# Altium footprint library Footprints.PcbLib: 29 footprints (part 1 of 2)
Each footprint in its own frame and in the unit in brackets; x right, y up, seen from the top. Pads: shape width x height; smd on the part's side, far side on the other; paste and mask are expansions set on the pad; w line width, h text height; cw(c..) or ccw(c..) is an arc to the next point about the centre after c.
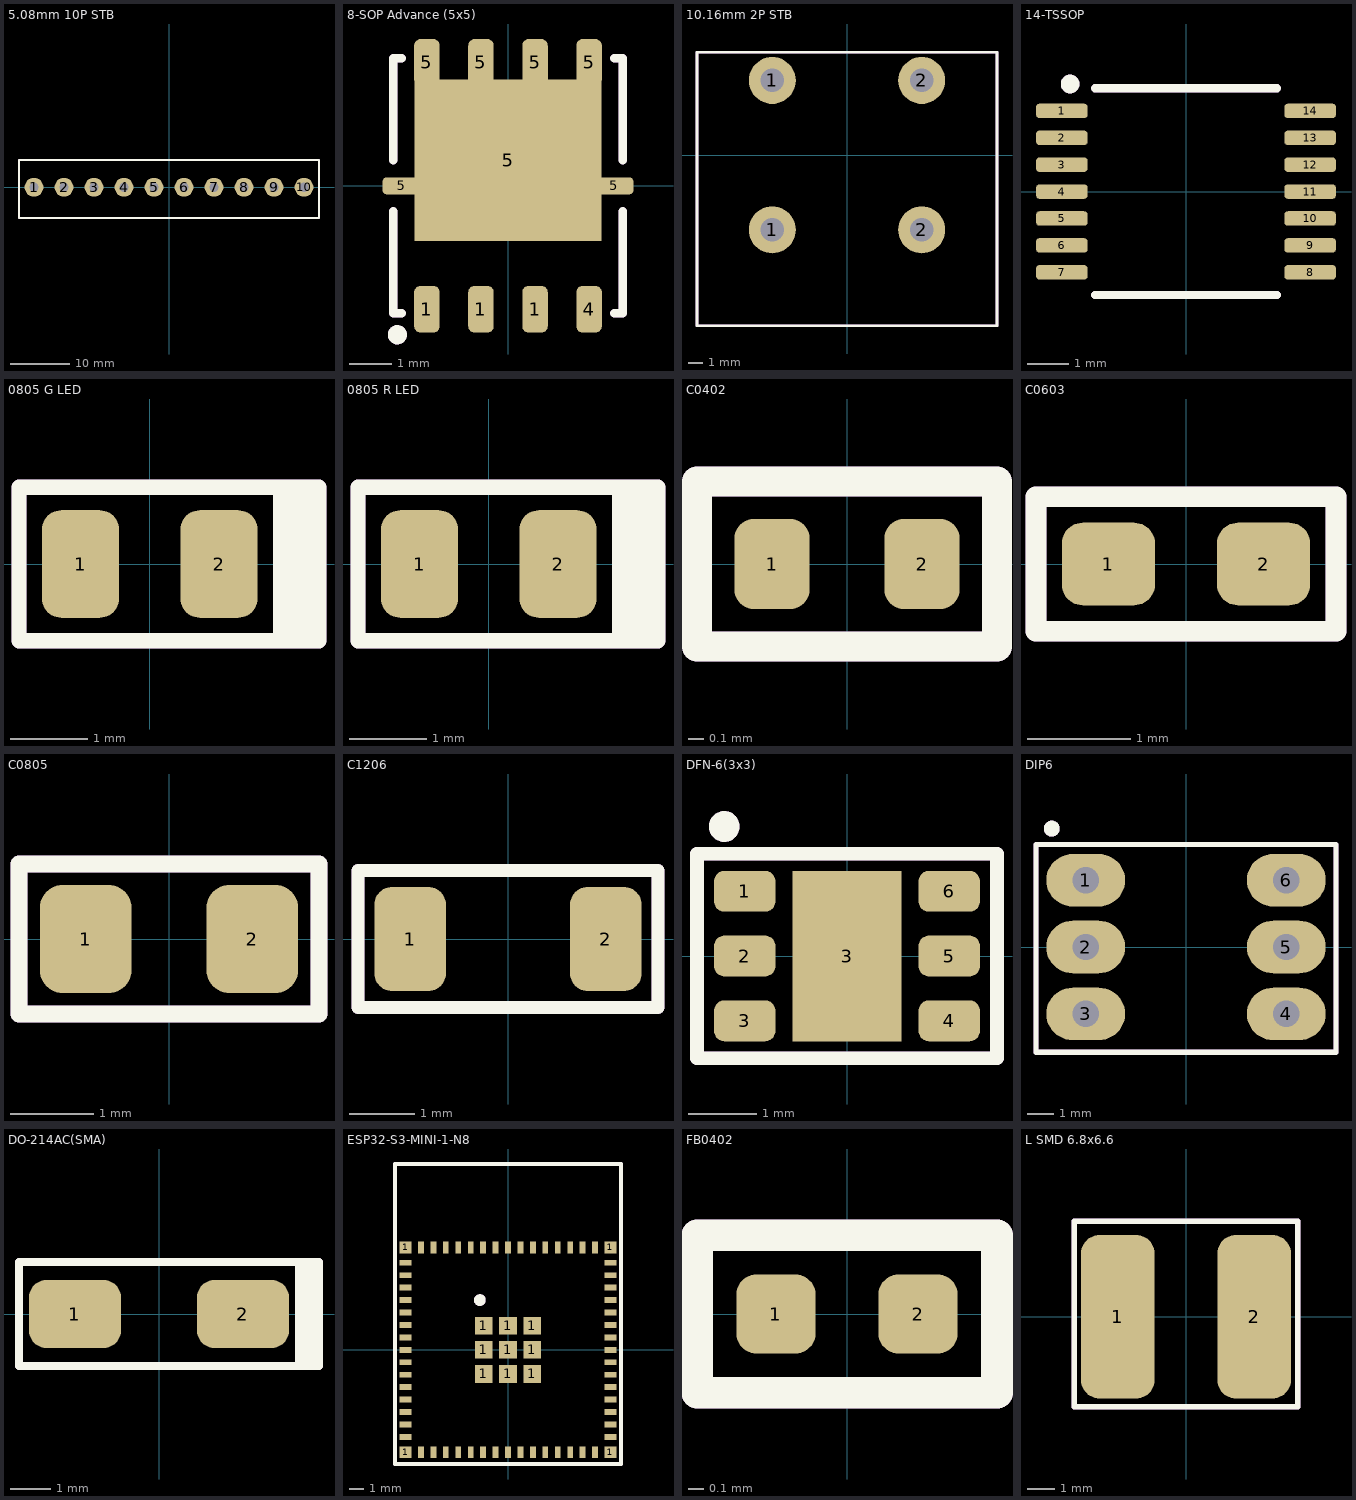
[diagram p0: the footprints below, top view; thin cyan lines are the x and y axes]

## 5.08mm 10P STB [mm]
pads (10):
  round 3.2 hole 1.6: 1(-22.86,0) 2(-17.78,0) 3(-12.7,0) 4(-7.62,0) 5(-2.54,0) 6(2.54,0) 7(7.62,0) 8(12.7,0) 9(17.78,0) 10(22.86,0)
Top Overlay:
  lines w0.3: -25.4,-5.2 25.4,-5.2 25.4,4.6 -25.4,4.6 -25.4,-5.2
Top Assembly:
  lines w0.3: -25.4,-5.2 25.4,-5.2 25.4,4.6 -25.4,4.6 -25.4,-5.2
  text ".Designator" at -4.998,-0.333 h1
3D body "5.08mm 10P Screw Terminal Block.step": height 13.8, standoff -3.5, extent -25.4,-5.2 25.4,4.6

## 8-SOP Advance (5x5) [mm]
pads (11):
  rrect50% 0.6x1.1 smd: 1(-1.905,-2.9) 1(-0.635,-2.9) 1(0.635,-2.9) 4(1.905,-2.9) 5(-1.905,2.9) 5(-0.635,2.9) 5(0.635,2.9) 5(1.905,2.9)
  rrect50% 0.9x0.4 smd: 5(-2.5,0) 5(2.5,0)
  rect 4.4x3.8 smd: 5(0,0.6)
Top Overlay:
  circle w0.25: c-2.6,-3.5 r0.1
  lines w0.2: -2.7,-0.6 -2.7,-3 -2.5,-3 ; -2.7,0.6 -2.7,3 -2.5,3 ; 2.5,-3 2.7,-3 2.7,-0.6 ; 2.5,3 2.7,3 2.7,0.6
Top Assembly:
  circle w0.25: c-2.6,-3.5 r0.1
  lines w0.2: -2.7,-0.6 -2.7,-3 -2.5,-3 ; -2.7,0.6 -2.7,3 -2.5,3 ; 2.5,-3 2.7,-3 2.7,-0.6 ; 2.5,3 2.7,3 2.7,0.6
  text ".Designator" at -4.998,-0.333 h1
3D body "8-SOP Advance (5x5) (close).STEP": height 1.1, standoff 0, extent -2.45,-3 2.45,3

## 10.16mm 2P STB [mm]
pads (4):
  round 3.2 hole 1.6: 1(-5.08,-5.08) 1(-5.08,5.08) 2(5.08,-5.08) 2(5.08,5.08)
Top Overlay:
  lines w0.2: -10.2,-11.6 -10.2,7 10.2,7 10.2,-11.6 -10.2,-11.6
Top Assembly:
  lines w0.2: -10.2,-11.6 -10.2,7 10.2,7 10.2,-11.6 -10.2,-11.6
  text ".Designator" at -4.998,-0.333 h1
3D body "10.16mm 2P High Power Screw Termial Block.step": height 29.3, standoff -5, extent -10.16,-11.58 10.16,6.72

## 14-TSSOP [mm]
pads (14):
  rrect50% 1.25x0.35 smd: 1(-3,1.95) 2(-3,1.3) 3(-3,0.65) 4(-3,0) 5(-3,-0.65) 6(-3,-1.3) 7(-3,-1.95) 8(3,-1.95) 9(3,-1.3) 10(3,-0.65) 11(3,0) 12(3,0.65) 13(3,1.3) 14(3,1.95)
Top Overlay:
  circle w0.25: c-2.8,2.6 r0.1
  lines w0.2: -2.2,-2.5 2.2,-2.5 ; -2.2,2.5 2.2,2.5
Top Assembly:
  circle w0.25: c-2.8,2.6 r0.1
  lines w0.2: -2.2,-2.5 2.2,-2.5 ; -2.2,2.5 2.2,2.5
  text ".Designator" at -4.998,-0.333 h1
3D body "14-TSSOP.STEP": height 1.2, standoff 0, extent -3.2,-2.5 3.2,2.5

## 0805 G LED [mm]
pads (2):
  rrect50% 1x1.4 smd: 1(-0.9,0) 2(0.9,0)
Top Overlay:
  region: 2.2,1 1.7,1 1.7,-1 2.2,-1
  lines w0.2: 1.7,-1 1.7,1 ; -1.7,-1 -1.7,1 2.2,1 2.2,-1 -1.7,-1
Top Assembly:
  region: 2.2,1 1.7,1 1.7,-1 2.2,-1
  lines w0.2: 1.7,-1 1.7,1 ; -1.7,-1 -1.7,1 2.2,1 2.2,-1 -1.7,-1
  text ".Designator" at -3.999,-0.267 h0.8
3D body "LED-0805-Green.step": height 0.8, standoff -0.01, extent -1.01,-0.625 1.01,0.625

## 0805 R LED [mm]
pads (2):
  rrect50% 1x1.4 smd: 1(-0.9,0) 2(0.9,0)
Top Overlay:
  region: 2.2,1 1.7,1 1.7,-1 2.2,-1
  lines w0.2: 1.7,-1 1.7,1 ; -1.7,-1 2.2,-1 2.2,1 -1.7,1 -1.7,-1
Top Assembly:
  region: 2.2,1 1.7,1 1.7,-1 2.2,-1
  lines w0.2: 1.7,-1 1.7,1 ; -1.7,-1 2.2,-1 2.2,1 -1.7,1 -1.7,-1
  text ".Designator" at -3.999,-0.267 h0.8
3D body "LED-0805-Red.step": height 0.8, standoff -0.01, extent -1.01,-0.625 1.01,0.625

## C0402 [mm]
pads (2):
  rrect50% 0.5x0.6 smd: 1(-0.5,0) 2(0.5,0)
Top Overlay:
  lines w0.2: -1,-0.55 -1,0.55 1,0.55 1,-0.55 -1,-0.55
Top Assembly:
  lines w0.2: -1,-0.55 -1,0.55 1,0.55 1,-0.55 -1,-0.55
  text ".Designator" at -2.999,-0.2 h0.6
3D body "C0402.STEP": height 0.55, standoff 0, extent -0.5,-0.25 0.5,0.25

## C0603 [mm]
pads (2):
  rrect50% 0.9x0.8 smd: 1(-0.75,0) 2(0.75,0)
Top Overlay:
  lines w0.2: -1.45,-0.65 1.45,-0.65 1.45,0.65 -1.45,0.65 -1.45,-0.65
Top Assembly:
  lines w0.2: -1.45,-0.65 1.45,-0.65 1.45,0.65 -1.45,0.65 -1.45,-0.65
  text ".Designator" at -2.999,-0.2 h0.6
3D body "C0603.STEP": height 0.95, standoff 0, extent -0.8,-0.4 0.8,0.4

## C0805 [mm]
pads (2):
  rrect50% 1.1x1.3 smd: 1(-1,0) 2(1,0)
Top Overlay:
  lines w0.2: -1.8,-0.9 1.8,-0.9 1.8,0.9 -1.8,0.9 -1.8,-0.9
Top Assembly:
  lines w0.2: -1.8,-0.9 1.8,-0.9 1.8,0.9 -1.8,0.9 -1.8,-0.9
  text ".Designator" at -4.998,-0.333 h1
3D body "C0805.step": height 1.45, standoff 0, extent -0.997,-0.63 1.003,0.62

## C1206 [mm]
pads (2):
  rrect50% 1.1x1.6 smd: 1(-1.5,0) 2(1.5,0)
Top Overlay:
  lines w0.2: -2.3,-1.05 2.3,-1.05 2.3,1.05 -2.3,1.05 -2.3,-1.05
Top Assembly:
  lines w0.2: -2.3,-1.05 2.3,-1.05 2.3,1.05 -2.3,1.05 -2.3,-1.05
  text ".Designator" at -2.999,-0.2 h0.6
3D body "C1206.STEP": height 1.8, standoff 0, extent -1.6,-0.8 1.6,0.8

## DFN-6(3x3) [mm]
pads (7):
  rrect50% 0.9x0.6 smd: 1(-1.5,0.95) 2(-1.5,0) 3(-1.5,-0.95) 4(1.5,-0.95) 5(1.5,0) 6(1.5,0.95)
  rect 1.6x2.5 smd: 3(0,0)
Top Overlay:
  circle w0.25: c-1.8,1.9 r0.1
  lines w0.2: -2.2,-1.5 -2.2,1.5 1.5,1.5 2.2,1.5 2.2,-1.5 -2.2,-1.5
Top Assembly:
  circle w0.25: c-1.8,1.9 r0.1
  lines w0.2: -2.2,-1.5 -2.2,1.5 1.5,1.5 2.2,1.5 2.2,-1.5 -2.2,-1.5
  text ".Designator" at -4.998,-0.333 h1
3D body "DFN-6(3x3).step": height 1.01, standoff 0.01, extent -1.5,-1.5 1.5,1.5

## DIP6 [mm]
pads (6):
  oval 3x2 hole 1: 1(-3.81,2.54) 2(-3.81,0) 3(-3.81,-2.54) 4(3.81,-2.54) 5(3.81,0) 6(3.81,2.54)
Top Overlay:
  circle w0.3: c-5.1,4.5 r0.15
  lines w0.2: -5.7,-4 -5.7,3.9 5.7,3.9 5.7,-4 -5.7,-4
Top Assembly:
  circle w0.3: c-5.1,4.5 r0.15
  lines w0.2: -5.7,-4 -5.7,3.9 5.7,3.9 5.7,-4 -5.7,-4
  text ".Designator" at -4.998,-0.333 h1
3D body "IC Socket DIP-6 2.54x7.62mm.stp": height 5.11, standoff -2.99, extent -5,-3.81 5,3.81
3D body "DIP-6 2.54x7.62mm IC .stp": height 7.83, standoff 0.87, extent -4.4,-3.56 4.4,3.56

## DO-214AC(SMA) [mm]
pads (2):
  rrect50% 2.3x1.7 smd: 1(-2.1,0) 2(2.1,0)
Top Overlay:
  region: 4,-1.3 3.5,-1.3 3.5,1.3 4,1.3
  lines w0.2: 3.5,-1.3 3.5,1.3 ; -3.5,-1.3 -3.5,1.3 4,1.3 4,-1.3 -3.5,-1.3
Top Assembly:
  region: 4,-1.3 3.5,-1.3 3.5,1.3 4,1.3
  lines w0.2: 3.5,-1.3 3.5,1.3 ; -3.5,-1.3 -3.5,1.3 4,1.3 4,-1.3 -3.5,-1.3
  text ".Designator" at -4.998,-0.333 h1
3D body "DO-214AC(SMA).step": height 2.26, standoff 0.02, extent -2.555,-1.335 2.555,1.335

## ESP32-S3-MINI-1-N8 [mm]
pads (73):
  rect 0.8x0.8 smd: 1(-7,-7) 1(-7,7) 1(7,-7) 1(7,7)
  rect 0.8x0.4 smd: 1(-7,5.1) 1(-7,5.95) 1(7,3.4) 1(7,4.25) 3(-7,4.25) 4(-7,3.4) 5(-7,2.55) 6(-7,1.7) 7(-7,0.85) 8(-7,0) 9(-7,-0.85) 10(-7,-1.7) 11(-7,-2.55) 12(-7,-3.4) 13(-7,-4.25) 14(-7,-5.1) 15(-7,-5.95) 31(7,-5.95) 32(7,-5.1) 33(7,-4.25) 34(7,-3.4) 35(7,-2.55) 36(7,-1.7) 37(7,-0.85) 38(7,0) 39(7,0.85) 40(7,1.7) 41(7,2.55) 44(7,5.1) 45(7,5.95)
  rect 0.4x0.8 smd: 1(-5.95,7) 1(-5.1,7) 1(-4.25,7) 1(-3.4,7) 1(-2.55,7) 1(-1.7,7) 1(-0.85,7) 1(0,7) 1(0.85,7) 1(1.7,7) 1(2.55,7) 1(3.4,7) 1(4.25,7) 1(5.1,7) 1(5.95,7) 16(-5.95,-7) 17(-5.1,-7) 18(-4.25,-7) 19(-3.4,-7) 20(-2.55,-7) 21(-1.7,-7) 22(-0.85,-7) 23(0,-7) 24(0.85,-7) 25(1.7,-7) 26(2.55,-7) 27(3.4,-7) 28(4.25,-7) 29(5.1,-7) 30(5.95,-7)
  rect 1.2x1.2 smd: 1(-1.65,-1.65) 1(-1.65,0) 1(-1.65,1.65) 1(0,-1.65) 1(0,0) 1(0,1.65) 1(1.65,-1.65) 1(1.65,0) 1(1.65,1.65)
Top Overlay:
  circle w0.4: c-1.925,3.4 r0.2
  lines w0.25: -7.725,-7.8 -7.725,12.7 ; -7.7,-7.8 7.7,-7.8 ; -7.7,12.7 7.7,12.7 ; 7.725,-7.8 7.725,12.7
Top Assembly:
  circle w0.4: c-1.925,3.4 r0.2
  lines w0.25: -7.725,-7.8 -7.725,12.7 ; -7.7,-7.8 7.7,-7.8 ; -7.7,12.7 7.7,12.7 ; 7.725,-7.8 7.725,12.7
  text ".Designator" at -4.998,-0.333 h1
3D body "ESP32-S3-MINI-1.STEP": height 2.4, standoff -0.02, extent -7.7,-7.75 7.7,12.75

## FB0402 [mm]
pads (2):
  rrect50% 0.5x0.5 smd: 1(-0.45,0) 2(0.45,0)
Top Overlay:
  lines w0.2: -0.95,-0.5 -0.95,0.5 0.95,0.5 0.95,-0.5 -0.95,-0.5
Top Assembly:
  lines w0.2: -0.95,-0.5 0.95,-0.5 0.95,0.5 -0.95,0.5 -0.95,-0.5
  text ".Designator" at -2.999,-0.2 h0.6
3D body "FB0402.stp": height 0.51, standoff 0.01, extent -0.5,-0.25 0.5,0.25

## L SMD 6.8x6.6 [mm]
pads (2):
  rrect50% 2.7x6 smd: 1(-2.5,0) 2(2.5,0)
Top Overlay:
  lines w0.2: -4.1,-3.3 4.1,-3.3 4.1,3.5 -4.1,3.5 -4.1,-3.3
Top Assembly:
  lines w0.2: -4.1,-3.3 4.1,-3.3 4.1,3.5 -4.1,3.5 -4.1,-3.3
  text ".Designator" at -4.998,-0.333 h1
3D body "L SMD,6.8x6.6mm.stp.step": height 6, standoff 0, extent -3.3,-3.4 3.3,3.4